# Altium footprint library C210 Rev_D_221221a.PcbLib: 89 footprints (part 1 of 6)
Each footprint in its own frame and in the unit in brackets; x right, y up, seen from the top. Pads: shape width x height; smd on the part's side, far side on the other; paste and mask are expansions set on the pad; w line width, h text height; cw(c..) or ccw(c..) is an arc to the next point about the centre after c.
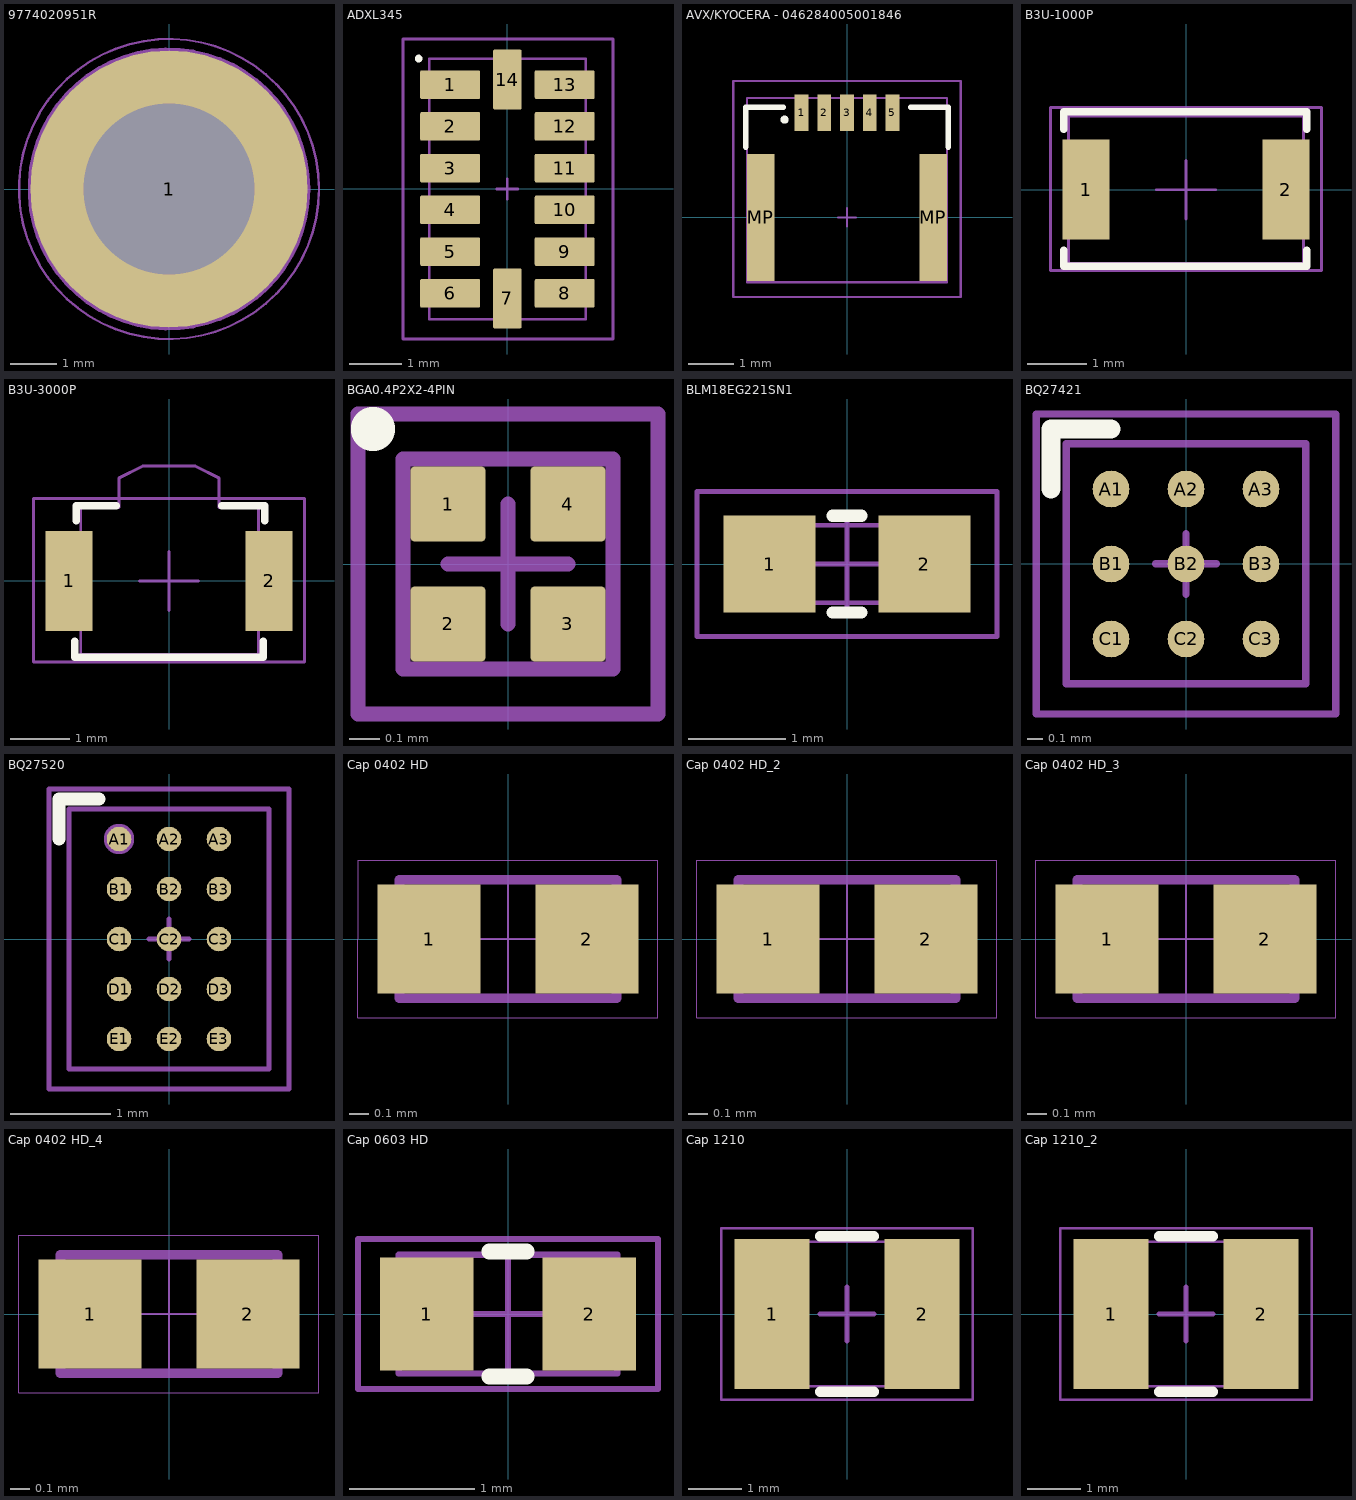
[diagram p0: the footprints below, top view; thin cyan lines are the x and y axes]

## 9774020951R [mm]
pads (1):
  round 6 / inner round 0 / far side round 0 hole 3.7 unplated paste-10: 1(0,0)
Top Paste:
  region: 0.32,1.873 0.416,1.854 0.604,1.802 0.785,1.73 0.958,1.641 1.121,1.534 1.273,1.411 1.411,1.273 1.534,1.121 1.641,0.958 1.73,0.785 1.802,0.604 1.854,0.416 1.873,0.32 2.899,0.32 2.902,0.323 2.884,0.486 2.811,0.807 2.703,1.117 2.561,1.413 2.386,1.692 2.181,1.949 1.949,2.181 1.692,2.386 1.413,2.561 1.117,2.703 0.807,2.811 0.486,2.884 0.323,2.902
  region: -1.873,0.32 -1.854,0.416 -1.802,0.604 -1.73,0.785 -1.641,0.958 -1.534,1.121 -1.411,1.273 -1.273,1.411 -1.121,1.534 -0.958,1.641 -0.785,1.73 -0.604,1.802 -0.416,1.854 -0.32,1.873 -0.32,2.899 -0.323,2.902 -0.486,2.884 -0.807,2.811 -1.117,2.703 -1.413,2.561 -1.692,2.386 -1.949,2.181 -2.181,1.949 -2.386,1.692 -2.561,1.413 -2.703,1.117 -2.811,0.807 -2.884,0.486 -2.902,0.323
  region: -0.32,-1.873 -0.416,-1.854 -0.604,-1.802 -0.785,-1.73 -0.958,-1.641 -1.121,-1.534 -1.273,-1.411 -1.411,-1.273 -1.534,-1.121 -1.641,-0.958 -1.73,-0.785 -1.802,-0.604 -1.854,-0.416 -1.873,-0.32 -2.899,-0.32 -2.902,-0.323 -2.884,-0.486 -2.811,-0.807 -2.703,-1.117 -2.561,-1.413 -2.386,-1.692 -2.181,-1.949 -1.949,-2.181 -1.692,-2.386 -1.413,-2.561 -1.117,-2.703 -0.807,-2.811 -0.486,-2.884 -0.323,-2.902
  region: 1.873,-0.32 1.854,-0.416 1.802,-0.604 1.73,-0.785 1.641,-0.958 1.534,-1.121 1.411,-1.273 1.273,-1.411 1.121,-1.534 0.958,-1.641 0.785,-1.73 0.604,-1.802 0.416,-1.854 0.32,-1.873 0.32,-2.899 0.323,-2.902 0.486,-2.884 0.807,-2.811 1.117,-2.703 1.413,-2.561 1.692,-2.386 1.949,-2.181 2.181,-1.949 2.386,-1.692 2.561,-1.413 2.703,-1.117 2.811,-0.807 2.884,-0.486 2.902,-0.323
Mechanical 11:
  text ".Designator" at -0.106,0.748 h0.5
Mechanical 13:
  circle w0.127: c0,0 r3
Mechanical 15:
  circle w0.05: c0,0 r3.25
  lines w0.05: -0.3,0 0.3,0 ; 0,-0.3 0,0.3
3D body "9774020951R (rev1).stp": height 2, standoff -1.4, extent -2.55,-2.55 2.55,2.55

## ADXL345 [mm]
pads (14):
  rrect10% 1.145x0.55 smd mask+0.05: 1(-1.097,2) 2(-1.097,1.2) 3(-1.098,0.4) 4(-1.098,-0.4) 5(-1.097,-1.2) 6(-1.097,-2) 8(1.097,-2) 9(1.097,-1.2) 10(1.098,-0.4) 11(1.097,0.4) 12(1.098,1.2) 13(1.097,2)
  rrect10% 0.55x1.145 smd mask+0.05: 7(0,-2.098) 14(0,2.098)
Top Overlay:
  circle w0.127: c-1.7,2.5 r0.01
Mechanical 11:
  text ".Designator" at 0.292,-0.8 h0.5
Mechanical 13:
  lines w0.05: -1.5,-2.5 -1.5,2.5 1.5,2.5 1.5,-2.5 -1.5,-2.5
Mechanical 15:
  lines w0.05: -0.2,0 0.2,0 ; 0,-0.2 0,0.2 ; -2,-2.875 -2,2.875 2.025,2.875 2.025,-2.875 -2,-2.875
3D body "User Library-ADXL345.step": height 1.01, standoff 0.01, extent -1.5,-2.5 1.5,2.5

## AVX/KYOCERA - 046284005001846 [mm]
pads (7):
  rect 0.3x0.8 smd mask+0.05: 1(-1,2.3) 2(-0.5,2.3) 3(0,2.3) 4(0.5,2.3) 5(1,2.3)
  rect 0.6x2.8 smd mask+0.05: MP(-1.9,0) MP(1.9,0)
Top Overlay:
  circle w0.127: c-1.375,2.15 r0.025
  lines w0.127: -2.225,1.55 -2.225,2.425 -1.4,2.425 ; 1.4,2.425 2.225,2.425 2.225,1.55
Mechanical 11:
  text ".Designator" at -0.5,0 h0.25
Mechanical 13:
  circle w0.1: c-0.991,2.286 r0.025
  lines w0.05: -2.2,-1.425 -2.2,2.625 2.2,2.625 2.2,-1.425 -2.2,-1.425
Mechanical 15:
  lines w0.05: -0.2,0 0.2,0 ; 0,-0.2 0,0.2 ; -2.5,-1.75 2.5,-1.75 2.5,3 -2.5,3 -2.5,-1.75
3D body "006284005001.stp": height 1.51, standoff 0.01, extent -2.2,-1.422 2.2,2.628

## B3U-1000P [mm]
pads (2):
  rect 0.8x1.7 smd: 1(-1.7,0) 2(1.7,0)
Top Overlay:
  lines w0.127: -2.075,-1.025 -2.075,-1.3 2.05,-1.3 2.05,-1.025 ; -2.075,1.025 -2.075,1.325 1.25,1.325 ; 0.9,1.325 2.05,1.325 2.05,1.025
Mechanical 11:
  text ".Designator" at -0.85,-0.425 h0.5
Mechanical 13:
  lines w0.05: -0.85,1.25 0.85,1.25 2,1.25 2,-1.25 -2,-1.25 -2,1.25 -0.85,1.25 ; -0.85,1.25 -0.85,1.25
Mechanical 15:
  lines w0.05: -0.5,0 0.5,0 ; 0,-0.5 0,0.5 ; -2.3,-1.375 2.3,-1.375 2.3,1.4 -2.3,1.4 -2.3,-1.375
3D body "B3U_1000P[].step": height 1.6, standoff 0, extent -2,-1.25 2,1.25

## B3U-3000P [mm]
pads (2):
  rect 0.8x1.7 smd: 1(-1.7,0) 2(1.7,0)
Top Overlay:
  lines w0.127: -1.6,-1.025 -1.6,-1.3 1.6,-1.3 1.6,-1.025 ; -1.575,1.025 -1.575,1.275 -0.9,1.275 ; 0.9,1.275 1.625,1.275 1.625,1.025
Mechanical 11:
  text ".Designator" at 0.975,0.35 h0.5
Mechanical 13:
  lines w0.05: -1.5,-1.25 -1.5,1.25 -0.85,1.25 -0.85,1.75 -0.45,1.95 0.45,1.95 0.85,1.75 0.85,1.25 1.525,1.25 1.525,-1.25 -1.5,-1.25
Mechanical 15:
  lines w0.05: -0.5,0 0.5,0 ; 0,-0.5 0,0.5 ; -2.3,-1.375 2.3,-1.375 2.3,1.4 -2.3,1.4 -2.3,-1.375
3D body: height 1.2, standoff 0.1, extent -0.85,1.25 0.85,1.95
3D body: height 1.35, standoff 0, extent -1.5,-1.25 1.5,1.25

## BGA0.4P2X2-4PIN [mm]
pads (4):
  rrect10% 0.25x0.25 smd paste-10 mask+0.036: 1(-0.2,0.2) 2(-0.2,-0.2) 3(0.2,-0.2) 4(0.2,0.2)
Top Overlay:
  circle w0.127: c-0.45,0.45 r0.01
Top Paste:
  circle w0.125: c0.2,0.2 r0.062
  circle w0.125: c0.2,-0.2 r0.062
  circle w0.125: c-0.2,-0.2 r0.062
  circle w0.125: c-0.2,0.2 r0.062
Mechanical 11:
  text ".Designator" at -0.325,-0.3 h0.25
Mechanical 13:
  circle w0.1: c-0.2,0.2 r0.01
  lines w0.05: -0.35,-0.35 -0.35,0.35 0.35,0.35 0.35,-0.35 -0.35,-0.35
Mechanical 15:
  lines w0.05: -0.2,0 0.2,0 ; 0,-0.2 0,0.2 ; -0.5,-0.5 -0.5,0.5 0.5,0.5 0.5,-0.5 -0.5,-0.5
3D body: height 0.17, standoff -0.05, extent 0.091,0.091 0.31,0.31
3D body: height 0.17, standoff -0.05, extent -0.309,0.091 -0.09,0.31
3D body: height 0.17, standoff -0.05, extent -0.309,-0.309 -0.09,-0.09
3D body: height 0.17, standoff -0.05, extent 0.091,-0.309 0.31,-0.09
3D body: height 0.32, standoff 0.05, extent -0.35,-0.35 0.35,0.35
3D body: height 0.34, standoff 0.33, extent -0.3,0.1 -0.101,0.3

## BLM18EG221SN1 [mm]
pads (2):
  rect 0.95x1 smd: 1(-0.8,0) 2(0.8,0)
Top Overlay:
  lines w0.127: -0.15,-0.5 0.15,-0.5 ; -0.15,0.5 0.15,0.5
Mechanical 11:
  text ".Designator" at -1.3,-0.425 h0.5
Mechanical 13:
  lines w0.05: -0.8,-0.4 -0.8,0.4 0.8,0.4 0.8,-0.4 -0.8,-0.4
Mechanical 15:
  lines w0.05: -0.5,0 0.5,0 ; 0,-0.5 0,0.5 ; -1.55,-0.75 -1.55,0.75 1.55,0.75 1.55,-0.75 -1.55,-0.75
3D body "BLM18EG221SN1.STEP": height 0.8, standoff 0, extent -0.8,-0.4 0.8,0.4

## BQ27421 [mm]
pads (9):
  round 0.245 smd paste-10 mask+0.05: A1(-0.5,0.5) A2(0,0.5) A3(0.5,0.5) B1(-0.5,0) B2(0,0) B3(0.5,0) C1(-0.5,-0.5) C2(0,-0.5) C3(0.5,-0.5)
Top Overlay:
  lines w0.127: -0.9,0.5 -0.9,0.9 -0.5,0.9
Top Paste:
  drawing of 9 lines, arcs and shapes, not listed
Mechanical 11:
  text ".Designator" at -0.5,-0.1 h0.25
Mechanical 13:
  circle w0.1: c-0.5,0.5 r0.01
  lines w0.05: -0.8,-0.8 0.8,-0.8 0.8,0.8 -0.8,0.8 -0.8,-0.8
Mechanical 15:
  lines w0.05: -0.2,0 0.2,0 ; 0,-0.2 0,0.2 ; -1,-1 -1,1 1,1 1,-1 -1,-1
3D body: height 0.25, standoff -0.05, extent 0.359,-0.148 0.65,0.148
3D body: height 0.25, standoff -0.05, extent -0.141,-0.648 0.15,-0.352
3D body: height 0.25, standoff -0.05, extent 0.359,-0.648 0.65,-0.352
3D body: height 0.25, standoff -0.05, extent -0.641,-0.648 -0.35,-0.352
3D body: height 0.25, standoff -0.05, extent -0.141,-0.148 0.15,0.148
3D body: height 0.25, standoff -0.05, extent 0.359,0.352 0.65,0.648
3D body: height 0.25, standoff -0.05, extent -0.141,0.352 0.15,0.648
3D body: height 0.25, standoff -0.05, extent -0.641,0.352 -0.35,0.648
3D body: height 0.25, standoff -0.05, extent -0.641,-0.148 -0.35,0.148
3D body: height 0.63, standoff 0.2, extent -0.8,-0.8 0.8,0.8
3D body: height 0.63, standoff 0.63, extent -0.7,0.5 -0.5,0.7

## BQ27520 [mm]
pads (15):
  round 0.245 smd paste-10 mask+0.05: A1(-0.5,1) A2(0,1) A3(0.5,1) B1(-0.5,0.5) B2(0,0.5) B3(0.5,0.5) C1(-0.5,0) C2(0,0) C3(0.5,0) D1(-0.5,-0.5) D2(0,-0.5) D3(0.5,-0.5) E1(-0.5,-1) E2(0,-1) E3(0.5,-1)
Top Overlay:
  lines w0.127: -1.1,1 -1.1,1.4 -0.7,1.4
Top Paste:
  drawing of 15 lines, arcs and shapes, not listed
Mechanical 11:
  text ".Designator" at -0.5,0 h0.25
Mechanical 13:
  circle w0.254: c-0.5,1 r0.025
  lines w0.05: -1,-1.3 -1,1.3 1,1.3 1,-1.3 -1,-1.3
Mechanical 15:
  lines w0.05: -0.2,0 0.2,0 ; 0,-0.2 0,0.2 ; -1.2,-1.5 1.2,-1.5 1.2,1.5 -1.2,1.5 -1.2,-1.5
3D body: height 0.25, standoff -0.05, extent -0.641,-1.148 -0.35,-0.852
3D body: height 0.25, standoff -0.05, extent -0.141,-1.148 0.15,-0.852
3D body: height 0.25, standoff -0.05, extent 0.359,-1.148 0.65,-0.852
3D body: height 0.25, standoff -0.05, extent -0.641,-0.648 -0.35,-0.352
3D body: height 0.25, standoff -0.05, extent -0.141,-0.648 0.15,-0.352
3D body: height 0.25, standoff -0.05, extent 0.359,-0.648 0.65,-0.352
3D body: height 0.63, standoff 0.63, extent -0.9,1 -0.7,1.2
3D body: height 0.63, standoff 0.2, extent -1,-1.3 1,1.3
3D body: height 0.25, standoff -0.05, extent -0.641,0.352 -0.35,0.648
3D body: height 0.25, standoff -0.05, extent -0.641,0.852 -0.35,1.148
3D body: height 0.25, standoff -0.05, extent -0.141,0.852 0.15,1.148
3D body: height 0.25, standoff -0.05, extent 0.359,0.852 0.65,1.148
3D body: height 0.25, standoff -0.05, extent -0.141,0.352 0.15,0.648
3D body: height 0.25, standoff -0.05, extent -0.641,-0.148 -0.35,0.148
3D body: height 0.25, standoff -0.05, extent 0.359,-0.148 0.65,0.148
3D body: height 0.25, standoff -0.05, extent -0.141,-0.148 0.15,0.148
3D body: height 0.25, standoff -0.05, extent 0.359,0.352 0.65,0.648

## Cap 0402 HD [mm]
pads (2):
  rect 0.52x0.55 smd: 1(-0.4,0) 2(0.4,0)
Mechanical 11:
  text ".Designator" at -0.4,-0.1 h0.5
Mechanical 13:
  lines w0.05: -0.55,-0.3 -0.55,0.3 0.55,0.3 0.55,-0.3 -0.55,-0.3
Mechanical 15:
  lines w0.005: -0.76,-0.4 0.76,-0.4 0.76,0.4 -0.76,0.4 -0.76,-0.4
  lines w0.01: -0.3,0 0.3,0 ; 0,-0.3 0,0.3
3D body: height 0.6, standoff 0, extent -0.35,-0.3 0.35,0.3
3D body: height 0.6, standoff 0, extent -0.55,-0.3 -0.35,0.3
3D body: height 0.6, standoff 0, extent 0.35,-0.3 0.55,0.3

## Cap 0402 HD_2 [mm]
pads (2):
  rect 0.52x0.55 smd: 1(-0.4,0) 2(0.4,0)
Mechanical 11:
  text ".Designator" at -0.4,-0.1 h0.15
Mechanical 13:
  lines w0.05: -0.55,-0.3 -0.55,0.3 0.55,0.3 0.55,-0.3 -0.55,-0.3
Mechanical 15:
  lines w0.005: -0.76,-0.4 0.76,-0.4 0.76,0.4 -0.76,0.4 -0.76,-0.4
  lines w0.01: -0.3,0 0.3,0 ; 0,-0.3 0,0.3
3D body: height 0.6, standoff 0, extent 0.35,-0.3 0.55,0.3
3D body: height 0.6, standoff 0, extent -0.55,-0.3 -0.35,0.3
3D body: height 0.6, standoff 0, extent -0.35,-0.3 0.35,0.3

## Cap 0402 HD_3 [mm]
pads (2):
  rect 0.52x0.55 smd: 1(-0.4,0) 2(0.4,0)
Mechanical 11:
  text ".Designator" at 0.816,0.182 h0.5
Mechanical 13:
  lines w0.05: -0.55,-0.3 0.55,-0.3 0.55,0.3 -0.55,0.3 -0.55,-0.3
Mechanical 15:
  lines w0.005: -0.76,-0.4 -0.76,0.4 0.76,0.4 0.76,-0.4 -0.76,-0.4
  lines w0.01: -0.3,0 0.3,0 ; 0,-0.3 0,0.3
3D body: height 0.6, standoff 0, extent -0.35,-0.3 0.35,0.3
3D body: height 0.6, standoff 0, extent -0.55,-0.3 -0.35,0.3
3D body: height 0.6, standoff 0, extent 0.35,-0.3 0.55,0.3

## Cap 0402 HD_4 [mm]
pads (2):
  rect 0.52x0.55 smd: 1(-0.4,0) 2(0.4,0)
Mechanical 11:
  text ".Designator" at -0.4,-0.1 h0.15
Mechanical 13:
  lines w0.05: -0.55,-0.3 0.55,-0.3 0.55,0.3 -0.55,0.3 -0.55,-0.3
Mechanical 15:
  lines w0.005: -0.76,-0.4 -0.76,0.4 0.76,0.4 0.76,-0.4 -0.76,-0.4
  lines w0.01: -0.3,0 0.3,0 ; 0,-0.3 0,0.3
3D body: height 0.6, standoff 0, extent -0.35,-0.3 0.35,0.3
3D body: height 0.6, standoff 0, extent -0.55,-0.3 -0.35,0.3
3D body: height 0.6, standoff 0, extent 0.35,-0.3 0.55,0.3

## Cap 0603 HD [mm]
pads (2):
  rect 0.75x0.9 smd: 1(-0.65,0) 2(0.65,0)
Top Overlay:
  lines w0.127: -0.15,-0.5 0.15,-0.5 ; -0.15,0.5 0.15,0.5
Mechanical 11:
  text ".Designator" at -1.025,-0.325 h0.7
Mechanical 13:
  lines w0.05: -0.875,-0.475 0.875,-0.475 0.875,0.475 -0.875,0.475 -0.875,-0.475
Mechanical 15:
  lines w0.05: -0.475,0 0.475,0 ; 0,-0.475 0,0.475 ; -1.2,-0.6 1.2,-0.6 1.2,0.6 -1.2,0.6 -1.2,-0.6
3D body: height 0.95, standoff 0, extent 0.525,-0.475 0.875,0.475
3D body: height 0.95, standoff 0, extent -0.875,-0.475 -0.525,0.475
3D body: height 0.95, standoff 0, extent -0.525,-0.475 0.525,0.475

## Cap 1210 [mm]
pads (2):
  rect 1.4x2.8 smd: 1(-1.4,0) 2(1.4,0)
Top Overlay:
  lines w0.2: -0.5,-1.45 0.5,-1.45 ; -0.5,1.45 0.5,1.45
Mechanical 11:
  text ".Designator" at -1.073,-0.395 h0.5
Mechanical 13:
  lines w0.05: -1.7,-1.35 1.7,-1.35 1.7,1.35 -1.7,1.35 -1.7,-1.35
Mechanical 15:
  lines w0.05: -2.35,-1.6 2.35,-1.6 2.35,1.6 -2.35,1.6 -2.35,-1.6
  lines w0.1: -0.5,0 0.5,0 ; 0,-0.5 0,0.5
3D body: height 2.8, standoff 0, extent 1.2,-1.35 1.7,1.35
3D body: height 2.8, standoff 0, extent -1.7,-1.35 -1.2,1.35
3D body: height 2.8, standoff 0, extent -1.2,-1.35 1.2,1.35

## Cap 1210_2 [mm]
pads (2):
  rect 1.4x2.8 smd: 1(-1.4,0) 2(1.4,0)
Top Overlay:
  lines w0.2: -0.5,-1.45 0.5,-1.45 ; -0.5,1.45 0.5,1.45
Mechanical 11:
  text ".Designator" at -0.675,-0.225 h0.5
Mechanical 13:
  lines w0.05: -1.7,-1.35 1.7,-1.35 1.7,1.35 -1.7,1.35 -1.7,-1.35
Mechanical 15:
  lines w0.05: -2.35,-1.6 2.35,-1.6 2.35,1.6 -2.35,1.6 -2.35,-1.6
  lines w0.1: -0.5,0 0.5,0 ; 0,-0.5 0,0.5
3D body: height 2.8, standoff 0, extent -1.2,-1.35 1.2,1.35
3D body: height 2.8, standoff 0, extent -1.7,-1.35 -1.2,1.35
3D body: height 2.8, standoff 0, extent 1.2,-1.35 1.7,1.35